# Altium footprint library General.PcbLib: 246 footprints (part 11 of 16)
Each footprint in its own frame and in the unit in brackets; x right, y up, seen from the top. Pads: shape width x height; smd on the part's side, far side on the other; paste and mask are expansions set on the pad; w line width, h text height; cw(c..) or ccw(c..) is an arc to the next point about the centre after c.
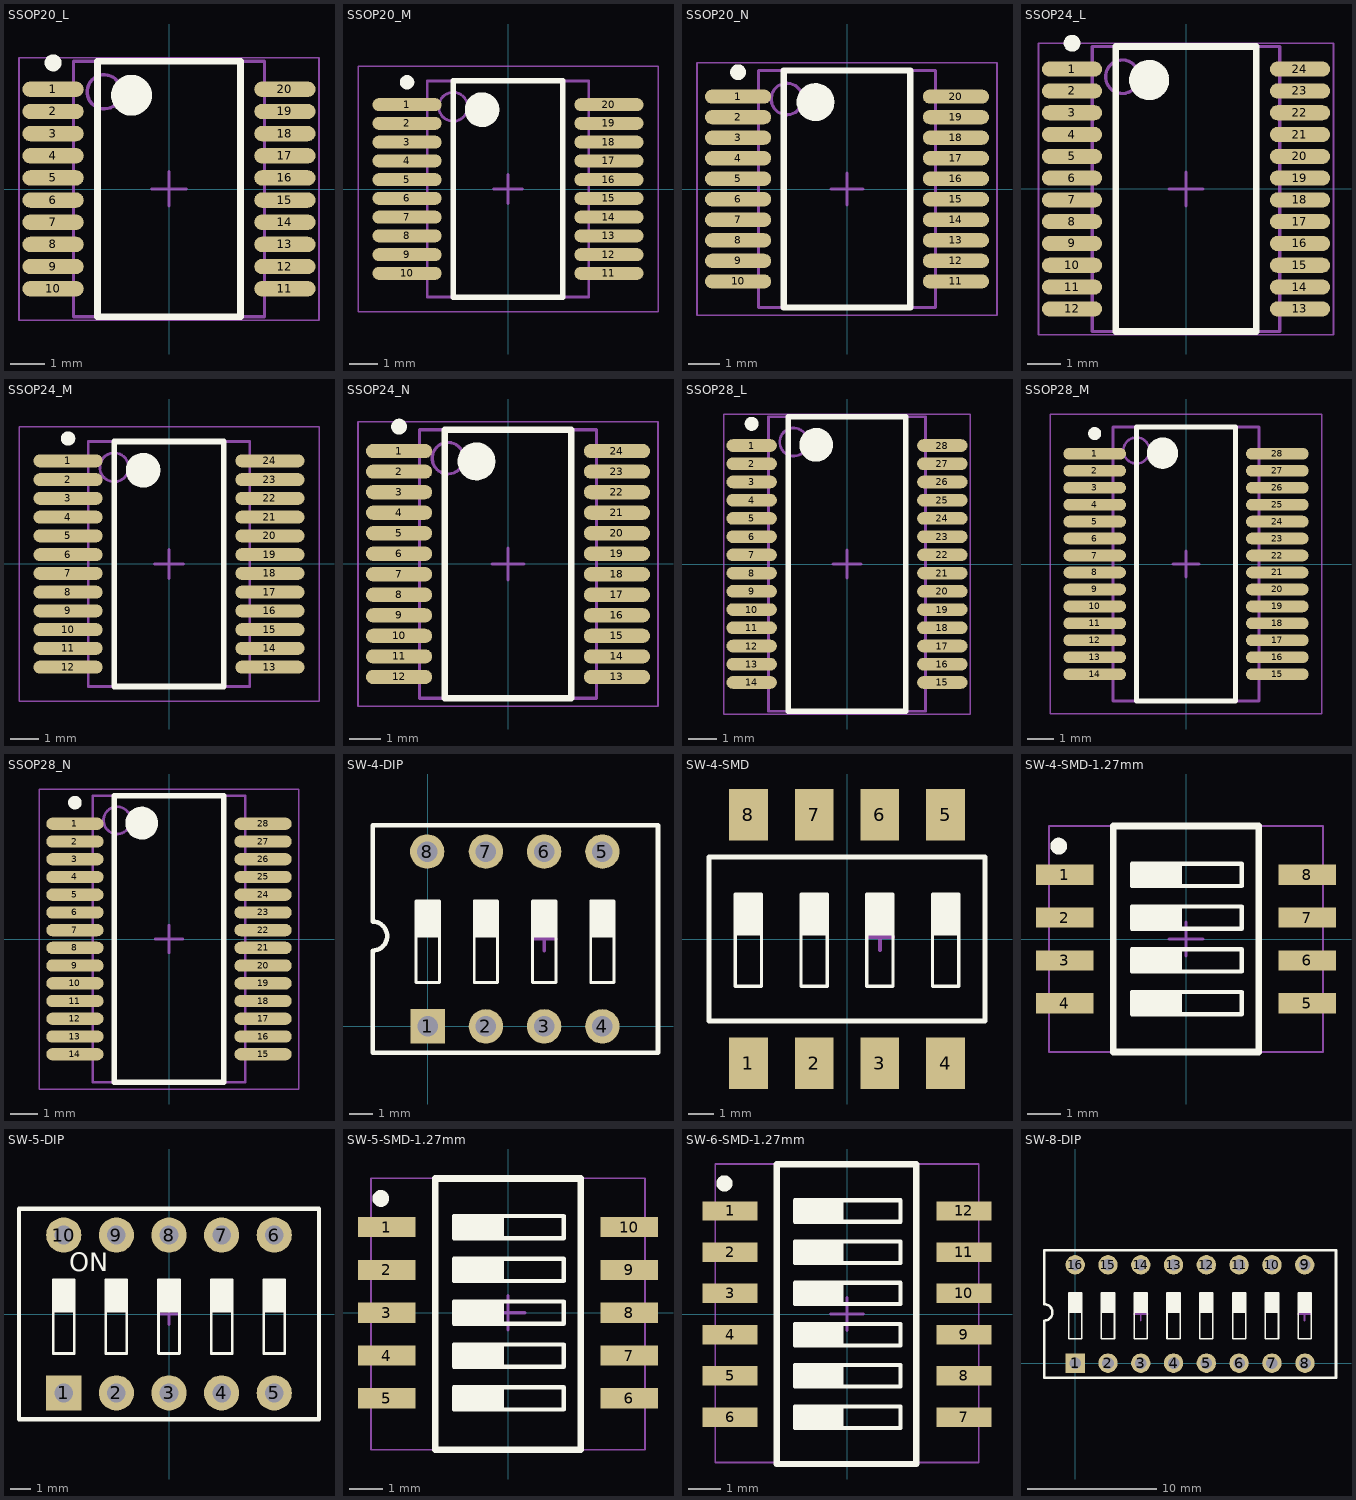
[diagram p10: the footprints below, top view; thin cyan lines are the x and y axes]

## SSOP20_L [mm] "SSOP, 20-Leads, Body 7.2x5.3mm, Pitch 0.65mm, IPC High Density"
height 2
pads (20):
  oval 1.8x0.45 smd: 1(-3.4,2.925) 2(-3.4,2.275) 3(-3.4,1.625) 4(-3.4,0.975) 5(-3.4,0.325) 6(-3.4,-0.325) 7(-3.4,-0.975) 8(-3.4,-1.625) 9(-3.4,-2.275) 10(-3.4,-2.925) 11(3.4,-2.925) 12(3.4,-2.275) 13(3.4,-1.625) 14(3.4,-0.975) 15(3.4,-0.325) 16(3.4,0.325) 17(3.4,0.975) 18(3.4,1.625) 19(3.4,2.275) 20(3.4,2.925)
Top Overlay:
  circle w0.25: c-3.4,3.7 r0.125
  circle w0.6: c-1.1,2.75 r0.3
  lines w0.2: -2.1,-3.75 -2.1,3.75 2.1,3.75 2.1,-3.75 -2.1,-3.75
Mechanical 13:
  circle w0.1: c-1.9,2.85 r0.5
  lines w0.1: -2.8,-3.75 -2.8,3.75 2.8,3.75 2.8,-3.75 -2.8,-3.75
Mechanical 15:
  lines w0.05: -4.4,-3.85 -4.4,3.85 4.4,3.85 4.4,-3.85 -4.4,-3.85
  lines w0.1: -0.5,0 0.5,0 ; 0,-0.5 0,0.5
3D body "DB0020A.stp": height 1.92, standoff -0.02, extent -3.888,-3.6 3.939,3.6

## SSOP20_M [mm] "SSOP, 20-Leads, Body 7.2x5.3mm, Pitch 0.65mm, IPC Low Density"
height 2
pads (20):
  oval 2.4x0.45 smd: 1(-3.5,2.925) 2(-3.5,2.275) 3(-3.5,1.625) 4(-3.5,0.975) 5(-3.5,0.325) 6(-3.5,-0.325) 7(-3.5,-0.975) 8(-3.5,-1.625) 9(-3.5,-2.275) 10(-3.5,-2.925) 11(3.5,-2.925) 12(3.5,-2.275) 13(3.5,-1.625) 14(3.5,-0.975) 15(3.5,-0.325) 16(3.5,0.325) 17(3.5,0.975) 18(3.5,1.625) 19(3.5,2.275) 20(3.5,2.925)
Top Overlay:
  circle w0.25: c-3.5,3.7 r0.125
  circle w0.6: c-0.9,2.75 r0.3
  lines w0.2: -1.9,-3.75 -1.9,3.75 1.9,3.75 1.9,-3.75 -1.9,-3.75
Mechanical 13:
  circle w0.1: c-1.9,2.85 r0.5
  lines w0.1: -2.8,-3.75 -2.8,3.75 2.8,3.75 2.8,-3.75 -2.8,-3.75
Mechanical 15:
  lines w0.05: -5.2,-4.25 -5.2,4.25 5.2,4.25 5.2,-4.25 -5.2,-4.25
  lines w0.1: -0.5,0 0.5,0 ; 0,-0.5 0,0.5
3D body "DB0020A.stp": height 1.92, standoff -0.02, extent -3.913,-3.6 3.913,3.6

## SSOP20_N [mm] "SSOP, 20-Leads, Body 7.2x5.3mm, Pitch 0.65mm, IPC Medium Density"
height 2
pads (20):
  oval 2.1x0.45 smd: 1(-3.45,2.925) 2(-3.45,2.275) 3(-3.45,1.625) 4(-3.45,0.975) 5(-3.45,0.325) 6(-3.45,-0.325) 7(-3.45,-0.975) 8(-3.45,-1.625) 9(-3.45,-2.275) 10(-3.45,-2.925) 11(3.45,-2.925) 12(3.45,-2.275) 13(3.45,-1.625) 14(3.45,-0.975) 15(3.45,-0.325) 16(3.45,0.325) 17(3.45,0.975) 18(3.45,1.625) 19(3.45,2.275) 20(3.45,2.925)
Top Overlay:
  circle w0.25: c-3.45,3.7 r0.125
  circle w0.6: c-1,2.75 r0.3
  lines w0.2: -2,-3.75 -2,3.75 2,3.75 2,-3.75 -2,-3.75
Mechanical 13:
  circle w0.1: c-1.9,2.85 r0.5
  lines w0.1: -2.8,-3.75 -2.8,3.75 2.8,3.75 2.8,-3.75 -2.8,-3.75
Mechanical 15:
  lines w0.05: -4.75,-4 -4.75,4 4.75,4 4.75,-4 -4.75,-4
  lines w0.1: -0.5,0 0.5,0 ; 0,-0.5 0,0.5
3D body "DB0020A.stp": height 1.92, standoff -0.02, extent -3.913,-3.6 3.913,3.6

## SSOP24_L [mm] "SSOP, 24-Leads, Body 8.2x5.3mm, Pitch 0.65mm, IPC High Density"
height 2
pads (24):
  oval 1.8x0.45 smd: 1(-3.4,3.575) 2(-3.4,2.925) 3(-3.4,2.275) 4(-3.4,1.625) 5(-3.4,0.975) 6(-3.4,0.325) 7(-3.4,-0.325) 8(-3.4,-0.975) 9(-3.4,-1.625) 10(-3.4,-2.275) 11(-3.4,-2.925) 12(-3.4,-3.575) 13(3.4,-3.575) 14(3.4,-2.925) 15(3.4,-2.275) 16(3.4,-1.625) 17(3.4,-0.975) 18(3.4,-0.325) 19(3.4,0.325) 20(3.4,0.975) 21(3.4,1.625) 22(3.4,2.275) 23(3.4,2.925) 24(3.4,3.575)
Top Overlay:
  circle w0.6: c-1.1,3.25 r0.3
  circle w0.25: c-3.4,4.35 r0.125
  lines w0.2: -2.1,-4.25 2.1,-4.25 2.1,4.25 -2.1,4.25 -2.1,-4.25
Mechanical 13:
  circle w0.1: c-1.9,3.35 r0.5
  lines w0.1: -2.8,-4.25 2.8,-4.25 2.8,4.25 -2.8,4.25 -2.8,-4.25
Mechanical 15:
  lines w0.05: -4.4,-4.35 4.4,-4.35 4.4,4.35 -4.4,4.35 -4.4,-4.35
  lines w0.1: -0.5,0 0.5,0 ; 0,-0.5 0,0.5
3D body "User Library-SSOP 24 PIN_.STEP": height 1.78, standoff -0.21, extent -3.95,-4.315 3.95,4.315

## SSOP24_M [mm] "SSOP, 24-Leads, Body 8.2x5.3mm, Pitch 0.65mm, IPC Low Density"
height 2
pads (24):
  oval 2.4x0.45 smd: 1(-3.5,3.575) 2(-3.5,2.925) 3(-3.5,2.275) 4(-3.5,1.625) 5(-3.5,0.975) 6(-3.5,0.325) 7(-3.5,-0.325) 8(-3.5,-0.975) 9(-3.5,-1.625) 10(-3.5,-2.275) 11(-3.5,-2.925) 12(-3.5,-3.575) 13(3.5,-3.575) 14(3.5,-2.925) 15(3.5,-2.275) 16(3.5,-1.625) 17(3.5,-0.975) 18(3.5,-0.325) 19(3.5,0.325) 20(3.5,0.975) 21(3.5,1.625) 22(3.5,2.275) 23(3.5,2.925) 24(3.5,3.575)
Top Overlay:
  circle w0.25: c-3.5,4.35 r0.125
  circle w0.6: c-0.9,3.25 r0.3
  lines w0.2: -1.9,-4.25 -1.9,4.25 1.9,4.25 1.9,-4.25 -1.9,-4.25
Mechanical 13:
  circle w0.1: c-1.9,3.35 r0.5
  lines w0.1: -2.8,-4.25 -2.8,4.25 2.8,4.25 2.8,-4.25 -2.8,-4.25
Mechanical 15:
  lines w0.05: -5.2,-4.75 -5.2,4.75 5.2,4.75 5.2,-4.75 -5.2,-4.75
  lines w0.1: -0.5,0 0.5,0 ; 0,-0.5 0,0.5
3D body "User Library-SSOP 24 PIN_.STEP": height 1.78, standoff -0.21, extent -3.95,-4.315 3.95,4.315

## SSOP24_N [mm] "SSOP, 24-Leads, Body 8.2x5.3mm, Pitch 0.65mm, IPC Medium Density"
height 2
pads (24):
  oval 2.1x0.45 smd: 1(-3.45,3.575) 2(-3.45,2.925) 3(-3.45,2.275) 4(-3.45,1.625) 5(-3.45,0.975) 6(-3.45,0.325) 7(-3.45,-0.325) 8(-3.45,-0.975) 9(-3.45,-1.625) 10(-3.45,-2.275) 11(-3.45,-2.925) 12(-3.45,-3.575) 13(3.45,-3.575) 14(3.45,-2.925) 15(3.45,-2.275) 16(3.45,-1.625) 17(3.45,-0.975) 18(3.45,-0.325) 19(3.45,0.325) 20(3.45,0.975) 21(3.45,1.625) 22(3.45,2.275) 23(3.45,2.925) 24(3.45,3.575)
Top Overlay:
  circle w0.25: c-3.45,4.35 r0.125
  circle w0.6: c-1,3.25 r0.3
  lines w0.2: -2,-4.25 -2,4.25 2,4.25 2,-4.25 -2,-4.25
Mechanical 13:
  circle w0.1: c-1.9,3.35 r0.5
  lines w0.1: -2.8,-4.25 -2.8,4.25 2.8,4.25 2.8,-4.25 -2.8,-4.25
Mechanical 15:
  lines w0.05: -4.75,-4.5 -4.75,4.5 4.75,4.5 4.75,-4.5 -4.75,-4.5
  lines w0.1: -0.5,0 0.5,0 ; 0,-0.5 0,0.5
3D body "User Library-SSOP 24 PIN_.STEP": height 1.78, standoff -0.21, extent -3.95,-4.315 3.95,4.315

## SSOP28_L [mm] "SSOP, 28-Leads, Body 10.2x5.3mm, Pitch 0.65mm, IPC High Density"
height 2
pads (28):
  oval 1.8x0.45 smd: 1(-3.4,4.225) 2(-3.4,3.575) 3(-3.4,2.925) 4(-3.4,2.275) 5(-3.4,1.625) 6(-3.4,0.975) 7(-3.4,0.325) 8(-3.4,-0.325) 9(-3.4,-0.975) 10(-3.4,-1.625) 11(-3.4,-2.275) 12(-3.4,-2.925) 13(-3.4,-3.575) 14(-3.4,-4.225) 15(3.4,-4.225) 16(3.4,-3.575) 17(3.4,-2.925) 18(3.4,-2.275) 19(3.4,-1.625) 20(3.4,-0.975) 21(3.4,-0.325) 22(3.4,0.325) 23(3.4,0.975) 24(3.4,1.625) 25(3.4,2.275) 26(3.4,2.925) 27(3.4,3.575) 28(3.4,4.225)
Top Overlay:
  circle w0.25: c-3.4,5 r0.125
  circle w0.6: c-1.1,4.25 r0.3
  lines w0.2: -2.1,-5.25 -2.1,5.25 2.1,5.25 2.1,-5.25 -2.1,-5.25
Mechanical 13:
  circle w0.1: c-1.9,4.35 r0.5
  lines w0.1: -2.8,-5.25 -2.8,5.25 2.8,5.25 2.8,-5.25 -2.8,-5.25
Mechanical 15:
  lines w0.05: -4.4,-5.35 -4.4,5.35 4.4,5.35 4.4,-5.35 -4.4,-5.35
  lines w0.1: -0.5,0 0.5,0 ; 0,-0.5 0,0.5
3D body "DB0028A.stp": height 1.92, standoff -0.03, extent -3.862,-5.1 3.964,5.1

## SSOP28_M [mm] "SSOP, 28-Leads, Body 10.2x5.3mm, Pitch 0.65mm, IPC Low Density"
height 2
pads (28):
  oval 2.4x0.45 smd: 1(-3.5,4.225) 2(-3.5,3.575) 3(-3.5,2.925) 4(-3.5,2.275) 5(-3.5,1.625) 6(-3.5,0.975) 7(-3.5,0.325) 8(-3.5,-0.325) 9(-3.5,-0.975) 10(-3.5,-1.625) 11(-3.5,-2.275) 12(-3.5,-2.925) 13(-3.5,-3.575) 14(-3.5,-4.225) 15(3.5,-4.225) 16(3.5,-3.575) 17(3.5,-2.925) 18(3.5,-2.275) 19(3.5,-1.625) 20(3.5,-0.975) 21(3.5,-0.325) 22(3.5,0.325) 23(3.5,0.975) 24(3.5,1.625) 25(3.5,2.275) 26(3.5,2.925) 27(3.5,3.575) 28(3.5,4.225)
Top Overlay:
  circle w0.6: c-0.9,4.25 r0.3
  circle w0.25: c-3.5,5 r0.125
  lines w0.2: -1.9,-5.25 1.9,-5.25 1.9,5.25 -1.9,5.25 -1.9,-5.25
Mechanical 13:
  circle w0.1: c-1.9,4.35 r0.5
  lines w0.1: -2.8,-5.25 2.8,-5.25 2.8,5.25 -2.8,5.25 -2.8,-5.25
Mechanical 15:
  lines w0.05: -5.2,-5.75 5.2,-5.75 5.2,5.75 -5.2,5.75 -5.2,-5.75
  lines w0.1: -0.5,0 0.5,0 ; 0,-0.5 0,0.5
3D body "DB0028A.stp": height 1.92, standoff -0.03, extent -3.862,-5.1 3.964,5.1

## SSOP28_N [mm] "SSOP, 28-Leads, Body 10.2x5.3mm, Pitch 0.65mm, IPC Medium Density"
height 2
pads (28):
  oval 2.1x0.45 smd: 1(-3.45,4.225) 2(-3.45,3.575) 3(-3.45,2.925) 4(-3.45,2.275) 5(-3.45,1.625) 6(-3.45,0.975) 7(-3.45,0.325) 8(-3.45,-0.325) 9(-3.45,-0.975) 10(-3.45,-1.625) 11(-3.45,-2.275) 12(-3.45,-2.925) 13(-3.45,-3.575) 14(-3.45,-4.225) 15(3.45,-4.225) 16(3.45,-3.575) 17(3.45,-2.925) 18(3.45,-2.275) 19(3.45,-1.625) 20(3.45,-0.975) 21(3.45,-0.325) 22(3.45,0.325) 23(3.45,0.975) 24(3.45,1.625) 25(3.45,2.275) 26(3.45,2.925) 27(3.45,3.575) 28(3.45,4.225)
Top Overlay:
  circle w0.25: c-3.45,5 r0.125
  circle w0.6: c-1,4.25 r0.3
  lines w0.2: -2,-5.25 -2,5.25 2,5.25 2,-5.25 -2,-5.25
Mechanical 13:
  circle w0.1: c-1.9,4.35 r0.5
  lines w0.1: -2.8,-5.25 -2.8,5.25 2.8,5.25 2.8,-5.25 -2.8,-5.25
Mechanical 15:
  lines w0.05: -4.75,-5.5 -4.75,5.5 4.75,5.5 4.75,-5.5 -4.75,-5.5
  lines w0.1: -0.5,0 0.5,0 ; 0,-0.5 0,0.5
3D body "DB0028A.stp": height 1.92, standoff -0.03, extent -3.812,-5.049 4.015,5.151

## SW-4-DIP [mm] "4位直插拨码开关"
pads (8):
  rect 1.5x1.5 hole 0.9: 1(-0.011,0.001)
  round 1.5 hole 0.9: 2(2.529,0.001) 3(5.069,0.001) 4(7.609,0.001) 5(7.609,7.621) 6(5.069,7.621) 7(2.529,7.621) 8(-0.031,7.621)
Top Overlay:
  rectangle: 7.101,3.938 8.117,5.462
  rectangle: 4.561,3.938 5.577,5.462
  rectangle: 2.021,3.938 3.037,5.462
  rectangle: -0.519,3.938 0.497,5.462
  lines w0.127: -0.519,3.938 0.497,3.938 ; 2.021,3.938 3.037,3.938 ; 4.561,3.938 5.577,3.938 ; 7.101,3.938 8.117,3.938 ; -0.519,1.906 0.497,1.906 0.497,5.462 -0.519,5.462 -0.519,1.906 ; 2.021,1.906 3.037,1.906 3.037,5.462 2.021,5.462 2.021,1.906 ; 4.561,1.906 5.577,1.906 5.577,5.462 4.561,5.462 4.561,1.906 ; 7.101,1.906 8.117,1.906 8.117,5.462 7.101,5.462 7.101,1.906
  lines w0.2: -2.413,-1.143 10.033,-1.143 10.033,8.763 -2.413,8.763 -2.413,4.572 cw(c-2.413,3.937) -2.413,3.302 -2.413,-1.143
Mechanical 15:
  lines w0.15: 4.561,3.811 5.577,3.811 ; 5.069,3.303 5.069,4.319
3D body "User Library-DIP SW 4P TH.STEP": height 3.8, standoff -8.5, extent -2.4,-1.08 10.02,8.7

## SW-4-SMD [mm] "pitch2.54mm   4位贴片拨码开关"
height 1.75
pads (8):
  rect 1.5x2 smd: 1(-3.81,-4.8) 2(-1.27,-4.8) 3(1.27,-4.8) 4(3.81,-4.8) 5(3.81,4.8) 6(1.27,4.8) 7(-1.27,4.8) 8(-3.81,4.8)
Top Overlay:
  rectangle: -4.318,0.203 -3.302,1.727
  rectangle: -1.778,0.203 -0.762,1.727
  rectangle: 0.762,0.203 1.778,1.727
  rectangle: 3.302,0.203 4.318,1.727
  lines w0.127: -4.318,0.203 -3.302,0.203 ; -1.778,0.203 -0.762,0.203 ; 0.762,0.203 1.778,0.203 ; 3.302,0.203 4.318,0.203 ; -4.318,-1.829 -4.318,1.727 -3.302,1.727 -3.302,-1.829 -4.318,-1.829 ; -1.778,-1.829 -1.778,1.727 -0.762,1.727 -0.762,-1.829 -1.778,-1.829 ; 0.762,-1.829 0.762,1.727 1.778,1.727 1.778,-1.829 0.762,-1.829 ; 3.302,-1.829 3.302,1.727 4.318,1.727 4.318,-1.829 3.302,-1.829
  lines w0.2: -5.334,-0.861 -5.334,3.175 5.334,3.175 5.334,-3.175 -5.334,-3.175 -5.334,-0.762
Mechanical 15:
  lines w0.15: 0.762,0.076 1.778,0.076 ; 1.27,-0.432 1.27,0.584
3D body "User Library-SMD DIP-4 switch.step": height 4.9, standoff 0, extent -5.55,-4.9 5.55,4.9

## SW-4-SMD-1.27mm [mm] "SWITCH, 8-Leads, Body 6.68x5.40mm, Pitch 1.27mm"
height 2.3
pads (8):
  rect 1.7x0.6 smd: 1(-3.6,1.905) 2(-3.6,0.635) 3(-3.6,-0.635) 4(-3.6,-1.905) 5(3.6,-1.905) 6(3.6,-0.635) 7(3.6,0.635) 8(3.6,1.905)
Top Overlay:
  circle w0.25: c-3.775,2.755 r0.125
  region: -0.178,-2.21 -0.178,-1.575 -1.6,-1.575 -1.6,-2.21
  region: -0.178,-0.94 -0.178,-0.305 -1.6,-0.305 -1.6,-0.94
  region: -0.178,0.33 -0.178,0.965 -1.6,0.965 -1.6,0.33
  region: -0.178,1.6 -0.178,2.21 -1.6,2.21 -1.6,1.6
  lines w0.127: -0.178,-2.21 -0.178,-1.6 ; -0.178,-0.94 -0.178,-0.33 ; -0.178,0.33 -0.178,0.94 ; -0.178,1.6 -0.178,2.21 ; -1.6,-2.235 -1.6,-1.575 1.651,-1.575 1.651,-2.235 -1.6,-2.235 ; -1.6,-0.965 -1.6,-0.305 1.651,-0.305 1.651,-0.965 -1.6,-0.965 ; -1.6,0.305 -1.6,0.965 1.651,0.965 1.651,0.305 -1.6,0.305 ; -1.6,1.575 1.651,1.575 1.651,2.235 -1.6,2.235 -1.6,1.575
  lines w0.2: -2.159,-3.35 -2.159,3.35 2.159,3.35 2.159,-3.35 -2.159,-3.35
Mechanical 13:
  lines w0.1: -2.159,-3.35 2.159,-3.35 2.159,3.35 -2.159,3.35 -2.159,-3.35
Mechanical 15:
  lines w0.05: -4.064,-3.353 -4.064,3.353 4.064,3.353 4.064,-3.353 -4.064,-3.353
  lines w0.1: -0.5,0 0.5,0 ; 0,-0.5 0,0.5
3D body "1234.step": height 2.6, standoff 0, extent -4.22,-3.125 4.22,3.125

## SW-5-DIP [mm] "14.2*9.9*7mm"
pads (10):
  rect 1.7x1.7 hole 0.9: 1(-5.08,-3.81)
  round 1.7 hole 0.9: 2(-2.54,-3.81) 3(0,-3.81) 4(2.54,-3.81) 5(5.08,-3.81) 6(5.08,3.81) 7(2.54,3.81) 8(0,3.81) 9(-2.54,3.81) 10(-5.08,3.81)
Top Overlay:
  rectangle: -5.588,0.127 -4.572,1.651
  rectangle: -3.048,0.127 -2.032,1.651
  rectangle: -0.508,0.127 0.508,1.651
  rectangle: 2.032,0.127 3.048,1.651
  rectangle: 4.572,0.127 5.588,1.651
  lines w0.127: -5.588,0.127 -4.572,0.127 ; -3.048,0.127 -2.032,0.127 ; -0.508,0.127 0.508,0.127 ; 2.032,0.127 3.048,0.127 ; 4.572,0.127 5.588,0.127 ; -5.588,-1.905 -5.588,1.651 -4.572,1.651 -4.572,-1.905 -5.588,-1.905 ; -3.048,-1.905 -3.048,1.651 -2.032,1.651 -2.032,-1.905 -3.048,-1.905 ; -0.508,-1.905 -0.508,1.651 0.508,1.651 0.508,-1.905 -0.508,-1.905 ; 2.032,-1.905 2.032,1.651 3.048,1.651 3.048,-1.905 2.032,-1.905 ; 4.572,-1.905 4.572,1.651 5.588,1.651 5.588,-1.905 4.572,-1.905
  lines w0.2: -7.239,-5.08 -7.239,5.08 7.239,5.08 7.239,-5.08 -7.239,-5.08
  text "ON" at -4.826,1.778 h1.52
Mechanical 15:
  lines w0.15: -0.508,0 0.508,0 ; 0,-0.508 0,0.508
3D body "CSW DIP-5P.STEP": height 6.65, standoff -3.15, extent -7.13,-4.95 7.13,4.95

## SW-5-SMD-1.27mm [mm] "SWITCH, 10-Leads, Pitch 1.27mm"
height 2.3
pads (10):
  rect 1.7x0.6 smd: 1(-3.6,2.54) 2(-3.6,1.27) 3(-3.6,0) 4(-3.6,-1.27) 5(-3.6,-2.54) 6(3.6,-2.54) 7(3.6,-1.27) 8(3.6,0) 9(3.6,1.27) 10(3.6,2.54)
Top Overlay:
  circle w0.25: c-3.775,3.39 r0.125
  region: -0.178,-2.845 -0.178,-2.21 -1.6,-2.21 -1.6,-2.845
  region: -0.178,2.235 -0.178,2.845 -1.6,2.845 -1.6,2.235
  region: -0.178,0.965 -0.178,1.6 -1.6,1.6 -1.6,0.965
  region: -0.178,-0.305 -0.178,0.33 -1.6,0.33 -1.6,-0.305
  region: -0.178,-1.575 -0.178,-0.94 -1.6,-0.94 -1.6,-1.575
  lines w0.127: -0.178,-2.845 -0.178,-2.235 ; -0.178,-1.575 -0.178,-0.965 ; -0.178,-0.305 -0.178,0.305 ; -0.178,0.965 -0.178,1.575 ; -0.178,2.235 -0.178,2.845 ; -1.6,-2.87 -1.6,-2.21 1.651,-2.21 1.651,-2.87 -1.6,-2.87 ; -1.6,-1.6 1.651,-1.6 1.651,-0.94 -1.6,-0.94 -1.6,-1.6 ; -1.6,-0.33 1.651,-0.33 1.651,0.33 -1.6,0.33 -1.6,-0.33 ; -1.6,0.94 1.651,0.94 1.651,1.6 -1.6,1.6 -1.6,0.94 ; -1.6,2.21 -1.6,2.87 1.651,2.87 1.651,2.21 -1.6,2.21
  lines w0.2: -2.159,-4.064 2.159,-4.064 2.159,3.985 -2.159,3.985 -2.159,-4.064
Mechanical 13:
  lines w0.1: -2.159,-4.064 -2.159,3.985 2.159,3.985 2.159,-4.064 -2.159,-4.064
Mechanical 15:
  lines w0.05: -4.064,-4.064 4.064,-4.064 4.064,3.988 -4.064,3.988 -4.064,-4.064
  lines w0.1: -0.5,0 0.5,0 ; 0,-0.5 0,0.5
3D body "12345.step": height 2.6, standoff 0, extent -4.22,-3.76 4.22,3.76

## SW-6-SMD-1.27mm [mm] "SWITCH, 12-Leads, Pitch 1.27mm"
height 2.3
pads (12):
  rect 1.7x0.6 smd: 1(-3.6,3.175) 2(-3.6,1.905) 3(-3.6,0.635) 4(-3.6,-0.635) 5(-3.6,-1.905) 6(-3.6,-3.175) 7(3.6,-3.175) 8(3.6,-1.905) 9(3.6,-0.635) 10(3.6,0.635) 11(3.6,1.905) 12(3.6,3.175)
Top Overlay:
  circle w0.25: c-3.775,4.025 r0.125
  region: -0.178,-3.48 -0.178,-2.845 -1.6,-2.845 -1.6,-3.48
  region: -0.178,-2.21 -0.178,-1.575 -1.6,-1.575 -1.6,-2.21
  region: -0.178,2.87 -0.178,3.48 -1.6,3.48 -1.6,2.87
  region: -0.178,1.6 -0.178,2.235 -1.6,2.235 -1.6,1.6
  region: -0.178,0.33 -0.178,0.965 -1.6,0.965 -1.6,0.33
  region: -0.178,-0.94 -0.178,-0.305 -1.6,-0.305 -1.6,-0.94
  lines w0.127: -0.178,-3.48 -0.178,-2.87 ; -0.178,-2.21 -0.178,-1.6 ; -0.178,-0.94 -0.178,-0.33 ; -0.178,0.33 -0.178,0.94 ; -0.178,1.6 -0.178,2.21 ; -0.178,2.87 -0.178,3.48 ; -1.6,-3.505 -1.6,-2.845 1.651,-2.845 1.651,-3.505 -1.6,-3.505 ; -1.6,-2.235 -1.6,-1.575 1.651,-1.575 1.651,-2.235 -1.6,-2.235 ; -1.6,-0.965 1.651,-0.965 1.651,-0.305 -1.6,-0.305 -1.6,-0.965 ; -1.6,0.305 1.651,0.305 1.651,0.965 -1.6,0.965 -1.6,0.305 ; -1.6,1.575 1.651,1.575 1.651,2.235 -1.6,2.235 -1.6,1.575 ; -1.6,2.845 -1.6,3.505 1.651,3.505 1.651,2.845 -1.6,2.845
  lines w0.2: -2.159,-4.62 2.136,-4.62 2.136,4.62 -2.159,4.62 -2.159,-4.62
Mechanical 13:
  lines w0.1: -2.159,-4.572 -2.159,4.62 2.159,4.62 2.159,-4.572 -2.159,-4.572
Mechanical 15:
  lines w0.05: -4.064,-4.572 4.064,-4.572 4.064,4.623 -4.064,4.623 -4.064,-4.572
  lines w0.1: -0.5,0 0.5,0 ; 0,-0.5 0,0.5
3D body "123456.step": height 2.6, standoff 0, extent -4.22,-4.395 4.22,4.395

## SW-8-DIP [mm] "8位直插拨码开关"
pads (16):
  rect 1.5x1.5 hole 0.9: 1(-0.011,0.001)
  round 1.5 hole 0.9: 2(2.529,0.001) 3(5.069,0.001) 4(7.609,0.001) 5(10.149,0.001) 6(12.689,0.001) 7(15.229,0.001) 8(17.789,0.001) 9(17.769,7.621) 10(15.229,7.621) 11(12.689,7.621) 12(10.149,7.621) 13(7.609,7.621) 14(5.069,7.621) 15(2.529,7.621) 16(-0.011,7.621)
Top Overlay:
  rectangle: 17.261,3.938 18.277,5.462
  rectangle: 14.721,3.938 15.737,5.462
  rectangle: 12.181,3.938 13.197,5.462
  rectangle: 9.641,3.938 10.657,5.462
  rectangle: 7.101,3.938 8.117,5.462
  rectangle: 4.561,3.938 5.577,5.462
  rectangle: 2.021,3.938 3.037,5.462
  rectangle: -0.519,3.938 0.497,5.462
  lines w0.127: -0.519,3.938 0.497,3.938 ; 2.021,3.938 3.037,3.938 ; 4.561,3.938 5.577,3.938 ; 7.101,3.938 8.117,3.938 ; 9.641,3.938 10.657,3.938 ; 12.181,3.938 13.197,3.938 ; 14.721,3.938 15.737,3.938 ; 17.261,3.938 18.277,3.938 ; -0.519,1.906 0.497,1.906 0.497,5.462 -0.519,5.462 -0.519,1.906 ; 2.021,1.906 3.037,1.906 3.037,5.462 2.021,5.462 2.021,1.906 ; 4.561,1.906 5.577,1.906 5.577,5.462 4.561,5.462 4.561,1.906 ; 7.101,1.906 8.117,1.906 8.117,5.462 7.101,5.462 7.101,1.906 ; 9.641,1.906 10.657,1.906 10.657,5.462 9.641,5.462 9.641,1.906 ; 12.181,1.906 13.197,1.906 13.197,5.462 12.181,5.462 12.181,1.906 ; 14.721,1.906 15.737,1.906 15.737,5.462 14.721,5.462 14.721,1.906 ; 17.261,1.906 18.277,1.906 18.277,5.462 17.261,5.462 17.261,1.906
  lines w0.2: -2.413,-1.143 -2.413,3.302 ccw(c-2.413,3.937) -2.413,4.572 -2.413,8.763 20.193,8.763 20.193,-1.143 -2.413,-1.143
Mechanical 15:
  lines w0.15: 4.561,3.811 5.577,3.811 ; 5.069,3.303 5.069,4.319 ; 17.261,3.811 18.277,3.811 ; 17.769,3.303 17.769,4.319
3D body "User Library-DIP SW 8P TH.STEP": height 8.5, standoff -3.8, extent -2.4,-1.08 20.18,8.7